# Altium footprint library SMD Connectors.PcbLib: 89 footprints (part 5 of 6)
Each footprint in its own frame and in the unit in brackets; x right, y up, seen from the top. Pads: shape width x height; smd on the part's side, far side on the other; paste and mask are expansions set on the pad; w line width, h text height; cw(c..) or ccw(c..) is an arc to the next point about the centre after c.
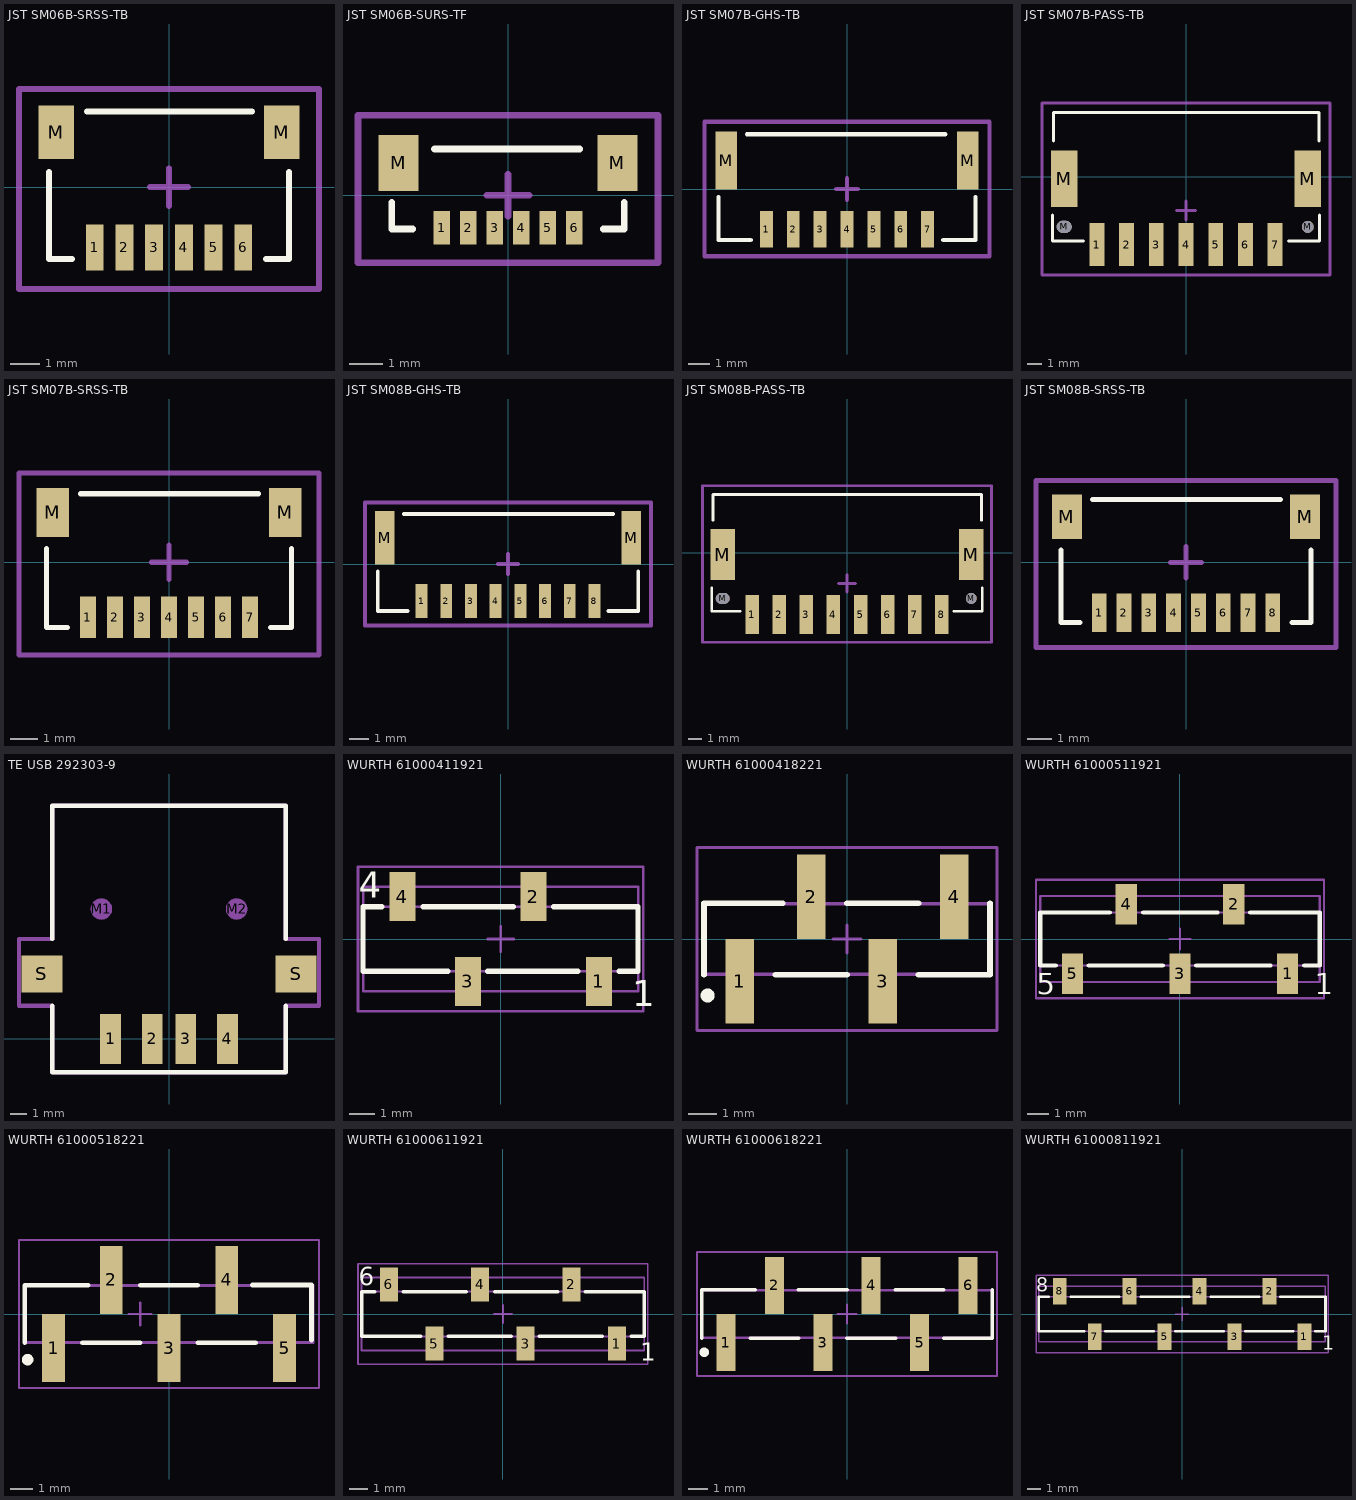
[diagram p4: the footprints below, top view; thin cyan lines are the x and y axes]

## JST SM06B-SRSS-TB [mm] "1.0mm pitch/Disconnectable Crimp style connector"
height 2.95
pads (8):
  rect 0.6x1.55 smd: 1(-2.5,-2.032) 2(-1.5,-2.032) 3(-0.5,-2.032) 4(0.5,-2.032) 5(1.5,-2.032) 6(2.5,-2.032)
  rect 1.2x1.8 smd: M(-3.8,1.843) M(3.8,1.843)
Top Overlay:
  lines w0.2: -4.032,0.508 -4.032,-2.413 -3.27,-2.413 ; -2.762,2.54 2.794,2.54 ; 3.27,-2.413 4.032,-2.413 4.032,0.508
Mechanical 15:
  lines w0.2: -0.635,0 0.635,0 ; 0,-0.635 0,0.635 ; -5.048,-3.429 5.048,-3.429 5.048,3.302 -5.048,3.302 -5.048,-3.429
3D body "JST SM06B-SRSS-TB.STEP": height 2.95, standoff -0.01, extent -4,-2.383 4,2.567

## JST SM06B-SURS-TF [mm] "1.0mm pitch/Disconnectable Crimp style connector"
height 2.95
pads (8):
  rect 0.5x1 smd: 1(-2,-0.975) 2(-1.2,-0.975) 3(-0.4,-0.975) 4(0.4,-0.975) 5(1.2,-0.975) 6(2,-0.975)
  rect 1.2x1.7 smd: M(-3.3,0.975) M(3.3,0.975)
Top Overlay:
  lines w0.2: -3.505,-0.213 -3.505,-1.016 -2.87,-1.016 ; -2.216,1.397 2.159,1.397 ; 2.87,-1.016 3.505,-1.016 3.505,-0.213
Mechanical 15:
  lines w0.2: -0.635,0 0.635,0 ; 0,-0.635 0,0.635 ; -4.521,-2.032 -4.521,2.413 4.521,2.413 4.521,-2.032 -4.521,-2.032
3D body "JST SM06B-SURS-TF.STEP": height 1.75, standoff 0, extent -3.5,-1.303 3.5,1.397

## JST SM07B-GHS-TB [mm] "1.25mm pitch/Disconnectable Crimp style connectors"
height 4.35
pads (9):
  rect 0.6x1.7 smd: 1(-3.75,-1.875) 2(-2.5,-1.875) 3(-1.25,-1.875) 4(0,-1.875) 5(1.25,-1.875) 6(2.5,-1.875) 7(3.75,-1.875)
  rect 1x2.7 smd: M(-5.625,1.325) M(5.625,1.325)
Top Overlay:
  lines w0.2: -5.975,-0.375 -5.975,-2.375 -4.475,-2.375 ; -4.649,2.54 4.572,2.54 ; 4.475,-2.375 5.975,-2.375 5.975,-0.375
Mechanical 15:
  lines w0.2: -0.5,0 0.5,0 ; 0,-0.5 0,0.5 ; -6.625,-3.125 6.625,-3.125 6.625,3.125 -6.625,3.125 -6.625,-3.125
3D body "JST SM07B-GHS-TB.STEP": height 4.35, standoff 0, extent -6,-2.31 6,2.54

## JST SM07B-PASS-TB [mm] "JST PA Series 2mm pitch, side entry connector"
height 5.7
pads (11):
  rect 1x2.9 smd: 1(-6,-4.575) 2(-4,-4.575) 3(-2,-4.575) 4(0,-4.575) 5(2,-4.575) 6(4,-4.575) 7(6,-4.575)
  oval 1x0.8 hole 0.8 slot 1 at 0 deg unplated mask+0.102: M(-8.2,-3.375)
  rect 1.8x3.8 smd: M(-8.2,-0.125) M(8.2,-0.125)
  round 0.8 hole 0.8 unplated mask+0.102: M(8.2,-3.375)
Top Overlay:
  lines w0.2: -9,-2.575 -9,-4.325 -6.905,-4.325 ; -8.921,2.41 -8.921,4.315 8.953,4.315 8.953,2.41 ; 6.905,-4.325 9,-4.325 9,-2.575
Mechanical 15:
  lines w0.2: -0.635,-2.265 0.635,-2.265 ; 0,-2.9 0,-1.63 ; -9.699,-6.607 -9.699,4.953 9.699,4.953 9.699,-6.607 -9.699,-6.607
3D body "JST SM07B-PASS-TB.STEP": height 5.8, standoff 0, extent -9,-5.641 9,4.359

## JST SM07B-SRSS-TB [mm] "1.0mm pitch/Disconnectable Crimp style connector"
height 2.95
pads (9):
  rect 0.6x1.55 smd: 1(-3,-2.032) 2(-2,-2.032) 3(-1,-2.032) 4(0,-2.032) 5(1,-2.032) 6(2,-2.032) 7(3,-2.032)
  rect 1.2x1.8 smd: M(-4.3,1.843) M(4.3,1.843)
Top Overlay:
  lines w0.2: -4.532,0.508 -4.532,-2.413 -3.77,-2.413 ; -3.262,2.54 3.302,2.54 ; 3.77,-2.413 4.532,-2.413 4.532,0.508
Mechanical 15:
  lines w0.2: -0.635,0 0.635,0 ; 0,-0.635 0,0.635 ; -5.548,-3.429 -5.548,3.302 5.548,3.302 5.548,-3.429 -5.548,-3.429
3D body "JST SM07B-SRSS-TB.STEP": height 2.95, standoff -0.01, extent -4.5,-2.383 4.5,2.567

## JST SM08B-GHS-TB [mm] "1.25mm pitch/Disconnectable Crimp style connectors"
height 4.35
pads (10):
  rect 0.6x1.7 smd: 1(-4.375,-1.875) 2(-3.125,-1.875) 3(-1.875,-1.875) 4(-0.625,-1.875) 5(0.625,-1.875) 6(1.875,-1.875) 7(3.125,-1.875) 8(4.375,-1.875)
  rect 1x2.7 smd: M(-6.25,1.325) M(6.25,1.325)
Top Overlay:
  lines w0.2: -6.6,-0.375 -6.6,-2.375 -5.1,-2.375 ; -5.274,2.54 5.334,2.54 ; 5.1,-2.375 6.6,-2.375 6.6,-0.375
Mechanical 15:
  lines w0.2: -0.5,0 0.5,0 ; 0,-0.5 0,0.5 ; -7.25,-3.125 7.25,-3.125 7.25,3.125 -7.25,3.125 -7.25,-3.125
3D body "JST SM08B-GHS-TB.STEP": height 4.35, standoff -0.05, extent -6.625,-2.31 6.625,2.54

## JST SM08B-PASS-TB [mm] "JST PA Series 2mm pitch, side entry connector"
height 5.7
pads (12):
  rect 1x2.9 smd: 1(-7,-4.575) 2(-5,-4.575) 3(-3,-4.575) 4(-1,-4.575) 5(1,-4.575) 6(3,-4.575) 7(5,-4.575) 8(7,-4.575)
  oval 1x0.8 hole 0.8 slot 1 at 0 deg unplated mask+0.102: M(-9.2,-3.375)
  rect 1.8x3.8 smd: M(-9.2,-0.125) M(9.2,-0.125)
  round 0.8 hole 0.8 unplated mask+0.102: M(9.2,-3.375)
Top Overlay:
  lines w0.2: -10,-2.575 -10,-4.325 -7.905,-4.325 ; -9.921,2.41 -9.921,4.315 9.953,4.315 9.953,2.41 ; 7.905,-4.325 10,-4.325 10,-2.575
Mechanical 15:
  lines w0.2: -0.635,-2.265 0.635,-2.265 ; 0,-2.9 0,-1.63 ; -10.699,-6.607 -10.699,4.953 10.699,4.953 10.699,-6.607 -10.699,-6.607
3D body "JST SM08B-PASS-TB.STEP": height 5.8, standoff 0, extent -10,-5.641 10,4.359

## JST SM08B-SRSS-TB [mm] "1.0mm pitch/Disconnectable Crimp style connector"
height 2.95
pads (10):
  rect 0.6x1.55 smd: 1(-3.5,-2.032) 2(-2.5,-2.032) 3(-1.5,-2.032) 4(-0.5,-2.032) 5(0.5,-2.032) 6(1.5,-2.032) 7(2.5,-2.032) 8(3.5,-2.032)
  rect 1.2x1.8 smd: M(-4.8,1.843) M(4.8,1.843)
Top Overlay:
  lines w0.2: -5.032,0.508 -5.032,-2.413 -4.27,-2.413 ; -3.762,2.54 3.81,2.54 ; 4.27,-2.413 5.032,-2.413 5.032,0.508
Mechanical 15:
  lines w0.2: -0.635,0 0.635,0 ; 0,-0.635 0,0.635 ; -6.048,-3.429 6.048,-3.429 6.048,3.302 -6.048,3.302 -6.048,-3.429
3D body "JST SM08B-SRSS-TB.STEP": height 2.95, standoff -0.01, extent -5,-2.383 5,2.567

## TE USB 292303-9 [mm]
pads (8):
  rect 1.25x3 smd: 1(-3.5,0) 2(-1,0) 3(1,0) 4(3.5,0)
  round 1.3 on Mech31: M1(-4.06,7.8) M2(4.06,7.8)
  rect 2.44x2.2 smd: S(-7.62,3.9) S(7.62,3.9)
Top Overlay:
  lines w0.254: -7,2 -7,-2 7,-2 7,2 ; -7,6 -7,14 7,14 7,6
Mechanical 15:
  lines w0.254: -9,2 -9,6 -7,6 -7,14 7,14 7,6 9,6 9,2 7,2 7,-2 -7,-2 -7,2 -9,2
3D body "TE SMT 292303-9.step": height 7.67, standoff -1.12, extent -8.63,-1 8.63,14.16

## WURTH 61000411921 [mm] "Socket Header, Pitch 2.54 mm, SMT, Vertical, single row, 4p"
height 7.5
pads (4):
  rect 1x1.91 smd: 1(3.81,-1.645) 2(1.27,1.645) 3(-1.27,-1.645) 4(-3.81,1.645)
Top Overlay:
  lines w0.2: -4.6,1.25 -5.33,1.25 -5.33,-1.25 -2.05,-1.25 ; -3,1.25 0.5,1.25 ; -0.5,-1.25 3,-1.25 ; 2.05,1.25 5.33,1.25 5.33,-1.25 4.6,-1.25
  text "1" at 5.1,-2.6 h1
  text "4" at -5.5,1.6 h1
Mechanical 11:
  lines w0.1: -5.33,-1.25 -5.33,1.25 5.33,1.25 5.33,-1.25 -5.33,-1.25
Mechanical 13:
  lines w0.1: -5.33,-2.025 -5.33,2.025 5.33,2.025 5.33,-2.025 -5.33,-2.025
Mechanical 15:
  lines w0.1: -0.5,0 0.5,0 ; 0,-0.5 0,0.5 ; -5.53,-2.8 -5.53,2.8 5.53,2.8 5.53,-2.8 -5.53,-2.8
3D body "61000411921.stp": height 7.5, standoff 0, extent -5.33,-2.025 5.33,2.025

## WURTH 61000418221 [mm] "SMT, 4 pins, 1 row, straight, Type 1, gold plating"
height 8.54
pads (4):
  rect 1x3 smd: 1(-3.81,-1.5) 2(-1.27,1.5) 3(1.27,-1.5) 4(3.81,1.5)
Top Overlay:
  circle w0.25: c-4.951,-2.008 r0.125
  lines w0.2: -5.08,-1.27 -5.08,1.27 -2.286,1.27 ; -2.54,-1.27 0,-1.27 ; 0,1.27 2.54,1.27 ; 2.54,-1.27 5.08,-1.27 5.08,1.27
Mechanical 13:
  lines w0.127: -5.08,-1.25 5.08,-1.25 5.08,1.25 -5.08,1.25 -5.08,-1.25
Mechanical 15:
  lines w0.1: -0.5,0 0.5,0 ; 0,-0.5 0,0.5 ; -5.33,-3.25 5.33,-3.25 5.33,3.25 -5.33,3.25 -5.33,-3.25
3D body "61000418221_TYPE_1.stp": height 9.29, standoff -0.04, extent -5.08,-2.5 5.08,2.5

## WURTH 61000511921 [mm] "Socket Header, Pitch 2.54 mm, SMT, Vertical, single row, 5p"
height 7.5
pads (5):
  rect 1x1.91 smd: 1(5.08,-1.645) 2(2.54,1.645) 3(0,-1.645) 4(-2.54,1.645) 5(-5.08,-1.645)
Top Overlay:
  lines w0.2: -5.87,-1.25 -6.6,-1.25 -6.6,1.25 -3.32,1.25 ; -4.31,-1.25 -0.81,-1.25 ; -1.73,1.25 1.77,1.25 ; 0.77,-1.25 4.27,-1.25 ; 3.32,1.25 6.6,1.25 6.6,-1.25 5.87,-1.25
  text "1" at 6.37,-2.6 h1
  text "5" at -6.77,-2.6 h1
Mechanical 11:
  lines w0.1: -6.6,-1.25 6.6,-1.25 6.6,1.25 -6.6,1.25 -6.6,-1.25
Mechanical 13:
  lines w0.1: -6.6,-2.025 6.6,-2.025 6.6,2.025 -6.6,2.025 -6.6,-2.025
Mechanical 15:
  lines w0.1: -0.5,0 0.5,0 ; 0,-0.5 0,0.5 ; -6.8,-2.8 6.8,-2.8 6.8,2.8 -6.8,2.8 -6.8,-2.8
3D body "61000511921.stp": height 7.5, standoff 0, extent -6.6,-2.025 6.6,2.025

## WURTH 61000518221 [mm] "SMT, 4 pins, 1 row, straight, Type 1, gold plating"
height 8.54
pads (5):
  rect 1x3 smd: 1(-5.08,-1.5) 2(-2.54,1.5) 3(0,-1.5) 4(2.54,1.5) 5(5.08,-1.5)
Top Overlay:
  circle w0.25: c-6.221,-2.008 r0.125
  lines w0.2: -6.35,-1.27 -6.35,1.27 -3.556,1.27 ; -3.81,-1.27 -1.27,-1.27 ; -1.27,1.27 1.27,1.27 ; 1.27,-1.27 3.81,-1.27 ; 3.655,1.275 6.262,1.275 6.262,-1.152
Mechanical 13:
  lines w0.127: -6.35,-1.25 -6.35,1.25 6.337,1.25 6.337,-1.25 -6.35,-1.25
Mechanical 15:
  lines w0.1: -1.77,0 -0.77,0 ; -1.27,-0.5 -1.27,0.5 ; -6.6,-3.25 -6.6,3.25 6.592,3.25 6.592,-3.25 -6.6,-3.25
3D body "W 5 pin.STEP": height 9.33, standoff 0, extent -6.358,-2.5 6.358,2.5

## WURTH 61000611921 [mm] "Socket Header, Pitch 2.54 mm, SMT, Vertical, single row, 6p"
height 7.5
pads (6):
  rect 1x1.91 smd: 1(6.35,-1.645) 2(3.81,1.645) 3(1.27,-1.645) 4(-1.27,1.645) 5(-3.81,-1.645) 6(-6.35,1.645)
Top Overlay:
  lines w0.2: -7.14,1.25 -7.87,1.25 -7.87,-1.25 -4.59,-1.25 ; -5.54,1.25 -2.04,1.25 ; -3.04,-1.25 0.46,-1.25 ; -0.46,1.25 3.04,1.25 ; 2.04,-1.25 5.54,-1.25 ; 4.59,1.25 7.87,1.25 7.87,-1.25 7.14,-1.25
  text "6" at -8.04,1.6 h1
  text "1" at 7.64,-2.6 h1
Mechanical 11:
  lines w0.1: -7.87,-1.25 7.87,-1.25 7.87,1.25 -7.87,1.25 -7.87,-1.25
Mechanical 13:
  lines w0.1: -7.87,-2.025 7.87,-2.025 7.87,2.025 -7.87,2.025 -7.87,-2.025
Mechanical 15:
  lines w0.1: -0.5,0 0.5,0 ; 0,-0.5 0,0.5 ; -8.07,-2.8 8.07,-2.8 8.07,2.8 -8.07,2.8 -8.07,-2.8
3D body "61000611921.stp": height 7.5, standoff 0, extent -7.87,-2.025 7.87,2.025

## WURTH 61000618221 [mm] "SMT, 6 pins, 1 row, straight, Type 1, gold plating"
height 8.54
pads (6):
  rect 1x3 smd: 1(-6.35,-1.5) 2(-3.81,1.5) 3(-1.27,-1.5) 4(1.27,1.5) 5(3.81,-1.5) 6(6.35,1.5)
Top Overlay:
  circle w0.25: c-7.491,-2.008 r0.125
  lines w0.2: -7.62,-1.27 -7.62,1.27 -4.826,1.27 ; -5.08,-1.27 -2.54,-1.27 ; -2.54,1.27 0,1.27 ; 0,-1.27 2.54,-1.27 ; 2.54,1.27 5.08,1.27 ; 5.08,-1.27 7.62,-1.27 7.62,1.27
Mechanical 13:
  lines w0.127: -7.62,-1.25 -7.62,1.25 7.62,1.25 7.62,-1.25 -7.62,-1.25
Mechanical 15:
  lines w0.1: -0.5,0 0.5,0 ; 0,-0.5 0,0.5 ; -7.87,-3.25 -7.87,3.25 7.87,3.25 7.87,-3.25 -7.87,-3.25
3D body "61000618221_TYPE_1.stp": height 9.29, standoff -0.04, extent -7.62,-2.5 7.62,2.5

## WURTH 61000811921 [mm] "Socket Header, Pitch 2.54 mm, SMT, Vertical, single row, 8p"
height 7.5
pads (8):
  rect 1x1.91 smd: 1(8.89,-1.645) 2(6.35,1.645) 3(3.81,-1.645) 4(1.27,1.645) 5(-1.27,-1.645) 6(-3.81,1.645) 7(-6.35,-1.645) 8(-8.89,1.645)
Top Overlay:
  lines w0.2: -9.68,1.25 -10.41,1.25 -10.41,-1.25 -7.13,-1.25 ; -8.08,1.25 -4.58,1.25 ; -5.58,-1.25 -2.08,-1.25 ; -3,1.25 0.5,1.25 ; -0.5,-1.25 3,-1.25 ; 2.08,1.25 5.58,1.25 ; 4.58,-1.25 8.08,-1.25 ; 7.13,1.25 10.41,1.25 10.41,-1.25 9.68,-1.25
  text "1" at 10.18,-2.6 h1
  text "8" at -10.58,1.6 h1
Mechanical 11:
  lines w0.1: -10.41,-1.25 10.41,-1.25 10.41,1.25 -10.41,1.25 -10.41,-1.25
Mechanical 13:
  lines w0.1: -10.41,-2.025 10.41,-2.025 10.41,2.025 -10.41,2.025 -10.41,-2.025
Mechanical 15:
  lines w0.1: -0.5,0 0.5,0 ; 0,-0.5 0,0.5 ; -10.61,-2.8 10.61,-2.8 10.61,2.8 -10.61,2.8 -10.61,-2.8
3D body "61000811921.stp": height 7.5, standoff 0, extent -10.41,-2.025 10.41,2.025